# Altium footprint library Connectors.PcbLib: 164 footprints (part 1 of 11)
Each footprint in its own frame and in the unit in brackets; x right, y up, seen from the top. Pads: shape width x height; smd on the part's side, far side on the other; paste and mask are expansions set on the pad; w line width, h text height; cw(c..) or ccw(c..) is an arc to the next point about the centre after c.
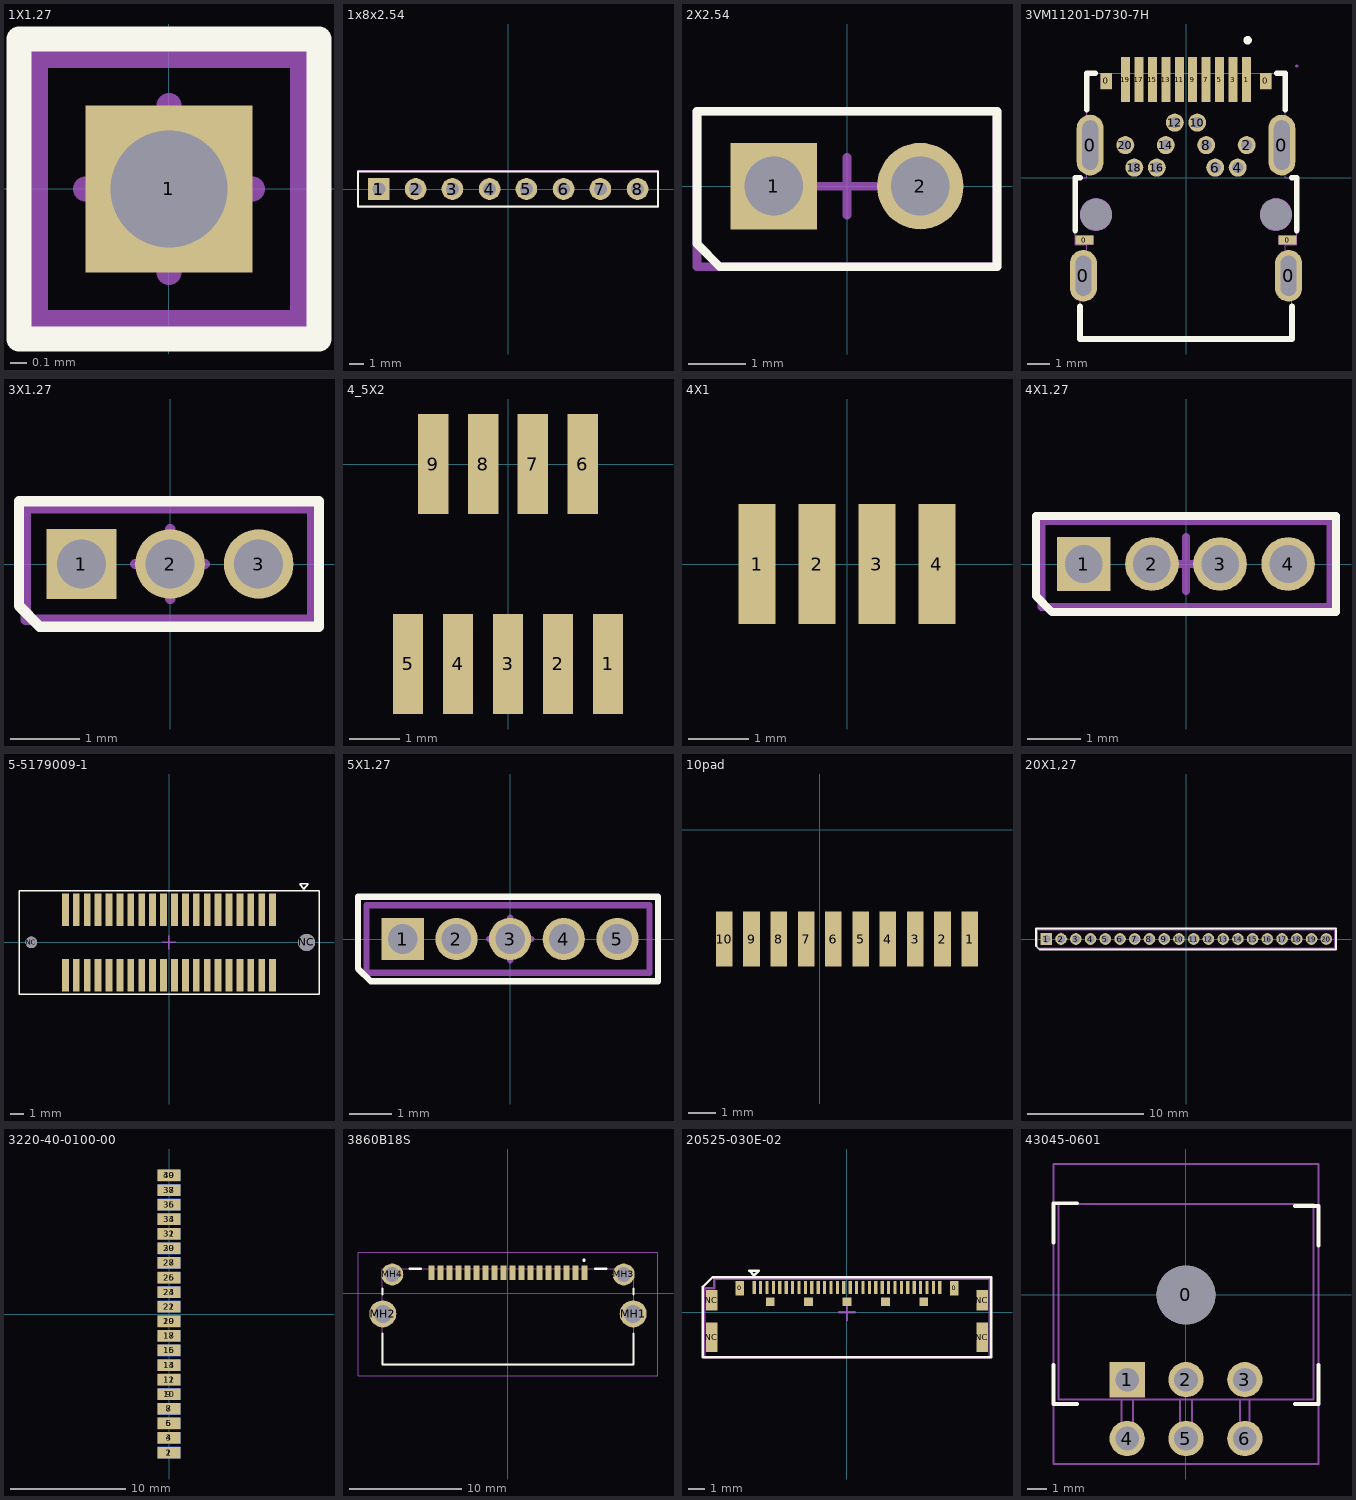
[diagram p0: the footprints below, top view; thin cyan lines are the x and y axes]

## 1X1.27 [mm]
pads (1):
  rect 1x1 hole 0.7: 1(0,0)
Top Overlay:
  lines w0.15: -0.9,-0.9 0.9,-0.9 0.9,0.9 -0.9,0.9 -0.9,-0.9
Mechanical 15:
  lines w0.15: -0.5,0 0.5,0 ; 0,-0.5 0,0.5 ; -0.8,-0.8 0.8,-0.8 0.8,0.8 -0.8,0.8 -0.8,-0.8

## 1x8x2.54 [mm]
height 3.5
pads (8):
  rect 1.5x1.5 hole 0.9: 1(-8.937,0)
  round 1.5 hole 0.9: 2(-6.392,0) 3(-3.852,0) 4(-1.282,0) 5(1.258,0) 6(3.828,0) 7(6.368,0) 8(8.938,0)
Top Overlay:
  lines w0.127: -10.372,-1.2 10.348,-1.2 10.348,1.2 -10.372,1.2 -10.372,-1.2
Mechanical 15:
  lines w0.15: -10.372,-1.25 10.348,-1.25 10.348,1.25 -10.372,1.25 -10.372,-1.25
3D body "pin right angle.step": height 3.57, standoff -2.6, extent -9.257,-0.32 -8.617,4.15
3D body "pin right angle.step": height 3.57, standoff -2.6, extent 8.618,-0.32 9.257,4.15
3D body "pin right angle.step": height 3.57, standoff -2.6, extent 6.048,-0.32 6.687,4.15
3D body "pin right angle.step": height 3.57, standoff -2.6, extent 3.508,-0.32 4.147,4.15
3D body "pin right angle.step": height 3.57, standoff -2.6, extent 0.938,-0.32 1.578,4.15
3D body "pin right angle.step": height 3.57, standoff -2.6, extent -1.602,-0.32 -0.962,4.15
3D body "pin right angle.step": height 3.57, standoff -2.6, extent -4.172,-0.32 -3.532,4.15
3D body "pin right angle.step": height 3.57, standoff -2.6, extent -6.712,-0.32 -6.072,4.15

## 2X2.54 [mm]
pads (2):
  rect 1.5x1.5 hole 1.02: 1(-1.27,0)
  round 1.5 hole 1.02: 2(1.27,0)
Top Overlay:
  lines w0.15: -2.6,-1 -2.6,1.3 2.6,1.3 2.6,-1.4 -2.2,-1.4 -2.6,-1
Mechanical 15:
  lines w0.15: -0.5,0 0.5,0 ; 0,-0.5 0,0.5 ; -2.6,-1.4 -2.6,1.3 2.6,1.3 2.6,-1.4 -2.6,-1.4
3D body "User Library-PLS-2.step": height 8.54, standoff -3, extent -2.54,-1.3 2.54,1.24

## 3VM11201-D730-7H [mm] "FOXCONN Mini DisplayPort connector"
pads (30):
  oval 1.2x2.3 hole 0.7 slot 1.8 at 90 deg paste-2539.97: 0(-4.56,-4.36) 0(4.56,-4.36)
  rect 0.8x0.4 smd: 0(-4.52,-2.776) 0(4.52,-2.776)
  oval 1.2x2.7 hole 0.7 slot 2.2 at 90 deg paste-2539.97: 0(-4.26,1.45) 0(4.26,1.45)
  rect 0.5x0.7 smd: 0(-3.55,4.3) 0(3.55,4.3)
  rect 0.4x2 smd: 1(2.7,4.36) 3(2.1,4.36) 5(1.5,4.36) 7(0.9,4.36) 9(0.3,4.36) 11(-0.3,4.36) 13(-0.9,4.36) 15(-1.5,4.36) 17(-2.1,4.36) 19(-2.7,4.36)
  round 0.8 hole 0.5 paste-2539.97: 2(2.7,1.45) 4(2.3,0.45) 6(1.3,0.45) 8(0.9,1.45) 10(0.5,2.45) 12(-0.5,2.45) 14(-0.9,1.45) 16(-1.3,0.45) 18(-2.3,0.45) 20(-2.7,1.45)
  round 0 hole 1.4 unplated: NC(-4,-1.64) NC(4,-1.64)
Top Overlay:
  circle w0.254: c2.74,6.11 r0.057
  lines w0.254: -4.925,-2.345 -4.925,0 -4.706,0 ; -4.71,-5.728 -4.71,-7.17 4.71,-7.17 4.71,-5.728 ; -4.41,3.017 -4.41,4.64 -4.031,4.64 ; 4.031,4.64 4.41,4.64 4.41,3.017 ; 4.706,0 4.925,0 4.925,-2.345
Top Paste:
  drawing of 28 lines, arcs and shapes, not listed
Keep-Out Layer:
  board cut-out: 4.7,-1.64 4.7,-1.548 4.652,-1.37 4.56,-1.21 4.43,-1.08 4.27,-0.988 4.092,-0.94 3.908,-0.94 3.73,-0.988 3.57,-1.08 3.44,-1.21 3.348,-1.37 3.3,-1.548 3.3,-1.64 3.3,-1.732 3.348,-1.91 3.44,-2.07 3.57,-2.2 3.73,-2.292 3.908,-2.34 4.092,-2.34 4.27,-2.292 4.43,-2.2 4.56,-2.07 4.652,-1.91 4.7,-1.732 4.7,-1.64
  board cut-out: -3.3,-1.64 -3.3,-1.548 -3.348,-1.37 -3.44,-1.21 -3.57,-1.08 -3.73,-0.988 -3.908,-0.94 -4.092,-0.94 -4.27,-0.988 -4.43,-1.08 -4.56,-1.21 -4.652,-1.37 -4.7,-1.548 -4.7,-1.64 -4.7,-1.732 -4.652,-1.91 -4.56,-2.07 -4.43,-2.2 -4.27,-2.292 -4.092,-2.34 -3.908,-2.34 -3.73,-2.292 -3.57,-2.2 -3.44,-2.07 -3.348,-1.91 -3.3,-1.732 -3.3,-1.64
Keep-Out Layer:
  circle w0.025: c4,-1.64 r0.7
  circle w0.025: c-4,-1.64 r0.7
Mechanical 1:
  circle w0.025: c4,-1.64 r0.7
  circle w0.025: c-4,-1.64 r0.7
Mechanical 15:
  drawing of 45 lines, arcs and shapes, not listed

## 3X1.27 [mm]
pads (3):
  rect 1x1 hole 0.7: 1(-1.27,0)
  round 1 hole 0.7: 2(0,0) 3(1.27,0)
Top Overlay:
  lines w0.15: -2.165,-0.6 -2.165,0.9 2.135,0.9 2.135,-0.9 -1.865,-0.9 -2.165,-0.6
Mechanical 15:
  lines w0.15: -0.5,0 0.5,0 ; 0,-0.5 0,0.5 ; -2.065,-0.8 -2.065,0.8 2.035,0.8 2.035,-0.8 -2.065,-0.8

## 4_5X2 [mm] "Pads 0.61x2mm"
pads (9):
  rect 0.61x2 smd: 1(2,-4) 2(1,-4) 3(0,-4) 4(-1,-4) 5(-2,-4) 6(1.5,0) 7(0.5,0) 8(-0.5,0) 9(-1.5,0)

## 4X1 [mm] "Pads 0.61x2mm"
pads (4):
  rect 0.61x2 smd: 1(-1.5,0) 2(-0.5,0) 3(0.5,0) 4(1.5,0)

## 4X1.27 [mm]
pads (4):
  rect 1x1 hole 0.7: 1(-1.905,0)
  round 1 hole 0.7: 2(-0.635,0) 3(0.635,0) 4(1.905,0)
Top Overlay:
  lines w0.15: -2.8,-0.6 -2.5,-0.9 2.8,-0.9 2.8,0.9 -2.8,0.9 -2.8,-0.6
Mechanical 15:
  lines w0.15: -0.5,0 0.5,0 ; 0,-0.5 0,0.5 ; -2.7,-0.8 2.7,-0.8 2.7,0.8 -2.7,0.8 -2.7,-0.8

## 5-5179009-1 [mm]
height 12
pads (42):
  rect 0.5x2.4 smd mask+0.05: 1(7.6,2.4) 2(7.6,-2.4) 3(6.8,2.4) 4(6.8,-2.4) 5(6,2.4) 6(6,-2.4) 7(5.2,2.4) 8(5.2,-2.4) 9(4.4,2.4) 10(4.4,-2.4) 11(3.6,2.4) 12(3.6,-2.4) 13(2.8,2.4) 14(2.8,-2.4) 15(2,2.4) 16(2,-2.4) 17(1.2,2.4) 18(1.2,-2.4) 19(0.4,2.4) 20(0.4,-2.4) 21(-0.4,2.4) 22(-0.4,-2.4) 23(-1.2,2.4) 24(-1.2,-2.4) 25(-2,2.4) 26(-2,-2.4) 27(-2.8,2.4) 28(-2.8,-2.4) 29(-3.6,2.4) 30(-3.6,-2.4) 31(-4.4,2.4) 32(-4.4,-2.4) 33(-5.2,2.4) 34(-5.2,-2.4) 35(-6,2.4) 36(-6,-2.4) 37(-6.8,2.4) 38(-6.8,-2.4) 39(-7.6,2.4) 40(-7.6,-2.4)
  round 0.85 hole 0.85 unplated mask+0.05: NC(-10.1,0)
  round 1.25 hole 1.25 unplated mask+0.05: NC(10.1,0)
Top Overlay:
  lines w0.1: -11,-3.8 11,-3.8 11,3.8 -11,3.8 -11,-3.8 ; 9.6,4.3 9.9,3.9 10.2,4.3 9.6,4.3
Mechanical 15:
  lines w0.1: -0.5,0 0.5,0 ; 0,-0.502 0,0.498
3D body "User Library-c-5-5179009-1-a-3d.step": height 7.7, standoff -0.55, extent -10.9,-3.4 10.9,3.4

## 5X1.27 [mm]
pads (5):
  rect 1x1 hole 0.7: 1(-2.54,0)
  round 1 hole 0.7: 2(-1.27,0) 3(0,0) 4(1.27,0) 5(2.54,0)
Top Overlay:
  lines w0.15: -3.6,-0.7 -3.6,1 3.5,1 3.5,-1 -3.3,-1 -3.6,-0.7
Mechanical 15:
  lines w0.15: -0.5,0 0.5,0 ; 0,-0.5 0,0.5 ; -3.4,-0.8 3.3,-0.8 3.3,0.8 0,0.8 -3.4,0.8 -3.4,-0.8

## 10pad [mm] "Pads 0.61x2mm"
pads (10):
  rect 0.61x2 smd: 1(5.5,-4) 2(4.5,-4) 3(3.5,-4) 4(2.5,-4) 5(1.5,-4) 6(0.5,-4) 7(-0.5,-4) 8(-1.5,-4) 9(-2.5,-4) 10(-3.5,-4)

## 20X1,27 [mm]
pads (20):
  rect 1x1 hole 0.7: 1(-12.065,0)
  round 1 hole 0.7: 2(-10.795,0) 3(-9.525,0) 4(-8.255,0) 5(-6.985,0) 6(-5.715,0) 7(-4.445,0) 8(-3.175,0) 9(-1.905,0) 10(-0.635,0) 11(0.635,0) 12(1.905,0) 13(3.175,0) 14(4.445,0) 15(5.715,0) 16(6.985,0) 17(8.255,0) 18(9.525,0) 19(10.795,0) 20(12.065,0)
Top Overlay:
  lines w0.15: 12.905,0.8 12.905,-0.9 -12.66,-0.9 -12.96,-0.6 -12.96,0.9 12.905,0.9
Mechanical 15:
  lines w0.15: -11.295,0 -10.295,0 ; -10.795,-0.5 -10.795,0.5 ; 12.705,-0.8 -12.86,-0.8 -12.86,0.8 12.705,0.8 ; 12.805,-0.8 12.805,0.8

## 3220-40-0100-00 [mm] "Connector Header Through Hole 40 position 0.050\" (1.27mm)"
pads (40):
  rect 2x1 smd: 1(0,-12.065) 3(0,-10.795) 5(0,-9.525) 7(0,-8.255) 9(0,-6.985) 11(0,-5.715) 13(0,-4.445) 15(0,-3.175) 17(0,-1.905) 19(0,-0.635) 21(0,0.635) 23(0,1.905) 25(0,3.175) 27(0,4.445) 29(0,5.715) 31(0,6.985) 33(0,8.255) 35(0,9.525) 37(0,10.795) 39(0,12.065)
  rect 2x1 smd far side: 2(0,-12.065) 4(0,-10.795) 6(0,-9.525) 8(0,-8.255) 10(0,-6.985) 12(0,-5.715) 14(0,-4.445) 16(0,-3.175) 18(0,-1.905) 20(0,-0.635) 22(0,0.635) 24(0,1.905) 26(0,3.175) 28(0,4.445) 30(0,5.715) 32(0,6.985) 34(0,8.255) 36(0,9.525) 38(0,10.795) 40(0,12.065)
3D body "3220-40-0100-00.STEP": height 2.1, standoff -3, extent -6.67,-15.85 0.83,15.85

## 3860B18S [mm]
pads (22):
  rect 0.5x1.3 smd: 1(6.8,1.825) 2(6,1.825) 3(5.2,1.825) 4(4.4,1.825) 5(3.6,1.825) 6(2.8,1.825) 7(2,1.825) 8(1.2,1.825) 9(0.4,1.825) 10(-0.4,1.825) 11(-1.2,1.825) 12(-2,1.825) 13(-2.8,1.825) 14(-3.6,1.825) 15(-4.4,1.825) 16(-5.2,1.825) 17(-6,1.825) 18(-6.8,1.825)
  round 2.4 hole 1.6: MH1(11.125,-1.825) MH2(-11.125,-1.825)
  round 1.95 hole 1.3: MH3(10.275,1.675) MH4(-10.275,1.675)
Top Overlay:
  lines w0.2: -11.15,-6.325 11.15,-6.325 ; -11.15,-6.325 11.15,-6.325 ; -11.15,-6.325 -11.15,-3.575 -11.15,-6.325 ; 6.7,2.925 ccw(c6.75,2.925) 6.8,2.925 ; 6.7,2.925 cw(c6.75,2.925) 6.8,2.925 ; 6.7,2.925 ccw(c6.75,2.925) 6.8,2.925 ; 11.15,-6.325 11.15,-3.575 11.15,-6.325 ; -11.15,-0.075 -11.15,0.425 -11.15,-0.075 ; -8.75,2.175 -7.75,2.175 -8.75,2.175 ; 7.75,2.175 8.75,2.175 7.75,2.175 ; 11.15,-0.075 11.15,0.425 11.15,-0.075
Mechanical 15:
  lines w0.1: -11.15,-6.325 11.15,-6.325 11.15,2.175 -11.15,2.175 -11.15,-6.325
Mechanical 20:
  lines w0.1: -13.325,-7.325 13.325,-7.325 13.325,3.65 -13.325,3.65 -13.325,-7.325
3D body "3860-B-18S.stp": height 4.32, standoff -1.78, extent -11.3,-6.514 11.3,2.225

## 20525-030E-02 [mm] "I-PEX"
height 1
pads (41):
  rect 0.55x0.9 smd mask+0.05: 0(-6.7,1.513) 0(6.7,1.513)
  rect 0.2x0.8 smd mask+0.05: 1(-5.8,1.563) 2(-5.4,1.563) 3(-5,1.563) 4(-4.6,1.563) 5(-4.2,1.563) 6(-3.8,1.563) 7(-3.4,1.563) 8(-3,1.563) 9(-2.6,1.563) 10(-2.2,1.563) 11(-1.8,1.563) 12(-1.4,1.563) 13(-1,1.563) 14(-0.6,1.563) 15(-0.2,1.563) 16(0.2,1.563) 17(0.6,1.563) 18(1,1.563) 19(1.4,1.563) 20(1.8,1.563) 21(2.2,1.563) 22(2.6,1.563) 23(3,1.563) 24(3.4,1.563) 25(3.8,1.563) 26(4.2,1.563) 27(4.6,1.563) 28(5,1.563) 29(5.4,1.563) 30(5.8,1.563)
  rect 0.71x1.85 smd mask+0.05: NC(-8.445,-1.562) NC(8.445,-1.562)
  rect 0.71x1.3 smd mask+0.05: NC(-8.445,0.763) NC(8.445,0.763)
  rect 0.55x0.55 smd mask+0.05: NC(-4.8,0.66) NC(-2.4,0.66) NC(0,0.66) NC(2.4,0.66) NC(4.8,0.66)
Top Overlay:
  lines w0.15: -9,-2.8 -9,1.6 -8.4,2.2 9,2.2 9,-2.8 -9,-2.8 ; -6.1,2.6 -5.5,2.6 -5.8,2.3 -6.1,2.6
Mechanical 13:
  lines w0.15: -0.5,0 0.5,0 ; 0,-0.5 0,0.5 ; -8.9,-2.8 -8.9,1.5 -8.3,1.5 -8.3,2.1 8.9,2.1 8.9,-2.8 -8.9,-2.8
3D body "20525-x30E-02C_RECE_ASS'Y_STEP_R7_ALL.STEP": height 1, standoff 0, extent -8.6,-2.588 8.6,1.562

## 43045-0601 [mm]
pads (7):
  round 3 hole 3 unplated: 0(0,0)
  rect 1.8x1.8 hole 1.2: 1(-3,-4.32)
  round 1.8 hole 1.2: 2(0,-4.32) 3(3,-4.32) 4(-3,-7.32) 5(0,-7.32) 6(3,-7.32)
Top Overlay:
  lines w0.2: -6.75,-3.57 -6.75,-5.57 -5.55,-5.57 ; -6.75,2.68 -6.75,4.68 -5.55,4.68 ; 5.55,-5.57 6.75,-5.57 6.75,-3.57 ; 5.55,4.53 6.75,4.53 6.75,2.53
Mechanical 13:
  lines w0.1: -3.3,-5.32 -3.3,-7.62 -2.7,-7.62 -2.7,-5.32 ; -0.3,-5.32 -0.3,-7.62 0.3,-7.62 0.3,-5.32 ; 2.75,-5.32 2.75,-7.62 3.25,-7.62 3.25,-5.32 ; -6.5,-5.32 6.5,-5.32 6.5,4.63 -6.5,4.63 -6.5,-5.32
  text "3" at 5,-3.82 h2
  text "1" at -4.5,-3.82 h2
  text ".Designator" at 3,3.18 h2
Mechanical 15:
  lines w0.1: -6.75,-8.62 -6.75,6.68 6.75,6.68 6.75,-8.62 -6.75,-8.62
3D body "430450601.stp": height 8.83, standoff -3.12, extent -6.575,-7.635 6.575,4.605